# Altium footprint library THU VIEN PCB.PCBLib: 911 footprints (part 35 of 57)
Each footprint in its own frame and in the unit in brackets; x right, y up, seen from the top. Pads: shape width x height; smd on the part's side, far side on the other; paste and mask are expansions set on the pad; w line width, h text height; cw(c..) or ccw(c..) is an arc to the next point about the centre after c.
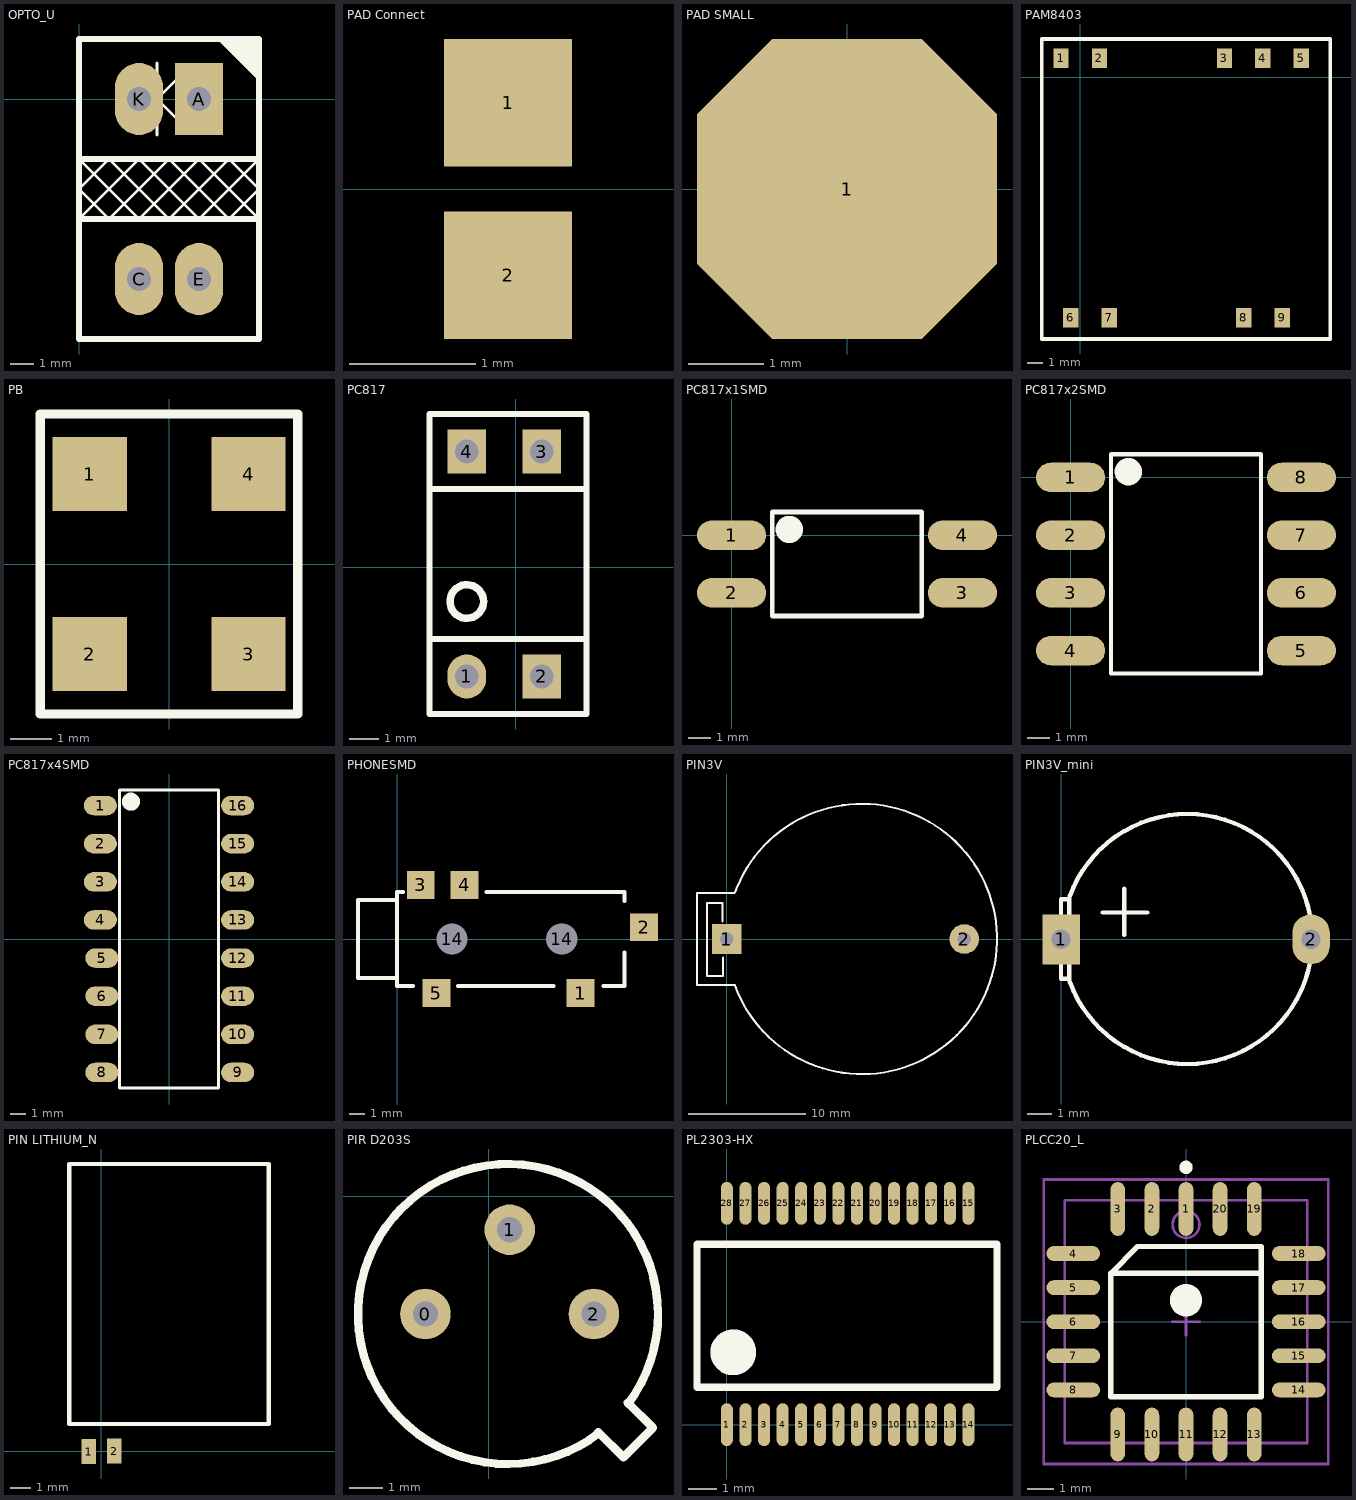
[diagram p34: the footprints below, top view; thin cyan lines are the x and y axes]

## OPTO_U [mil] "Opto hinh chu U"
height 104.33
pads (4):
  rect 80x120 hole 40: A(200,0)
  oval 80x120 hole 40: C(100,-300) E(200,-300) K(100,0)
Top Overlay:
  region: 297.5,97.5 232.5,97.5 297.5,32.5
  lines w5: 0,-200 50,-150 100,-100 200,-200 230,-170 300,-100 300,-200 200,-100 100,-200 90,-190 60,-160 0,-100 ; 130,-60 130,60 ; 180,-50 180,50 ; 180,-50 180,50 ; 180,-50 130,0 180,50 ; 0,-150 30,-180 50,-200 150,-100 250,-200 300,-150 250,-100 150,-200 50,-100 0,-150
  lines w10: 0,-200 300,-200 ; 0,-150 0,-110 ; 0,-100 300,-100 ; 300,-150 300,-140 ; 0,-400 300,-400 300,100 0,100 0,-400
3D body "SW3dPS-optek opb620.STEP": height 374.02, standoff -100, extent 43.46,-346.85 260,46.85

## PAD Connect [mil]
pads (2):
  rect 40x40 smd: 1(-66,27) 2(-66,-27)

## PAD SMALL [mm]
pads (1):
  oct 4x4 smd: 1(0,0)

## PAM8403 [mil]
pads (9):
  rect 40x50 smd: 1(-50,50) 2(50,50) 3(375,50) 4(475,50) 5(575,50) 6(-25,-625) 7(75,-625) 8(425,-625) 9(525,-625)
Top Overlay:
  lines w10: -100,-680 -100,100 650,100 650,-680 -75,-680 -100,-680

## PB [mil]
pads (4):
  rect 70x70 smd: 1(-75,85) 2(-75,-85) 3(75,-85) 4(75,85)
Top Overlay:
  lines w8.66: -121.75,-141.5 -121.75,141.75 121.5,141.75 121.5,-141.5 -121.75,-141.5

## PC817 [mm]
pads (4):
  oval 1.3x1.5 hole 0.8: 1(-1.651,-3.708)
  rect 1.3x1.5 hole 0.8: 2(0.889,-3.708) 3(0.889,3.912) 4(-1.651,3.912)
Top Overlay:
  circle w0.254: c-1.651,-1.168 r0.568
  lines w0.203: -2.921,-2.438 -2.921,-1.168 -2.921,1.372 -2.921,5.182 2.413,5.182 2.413,2.642 ; -2.921,-2.438 -2.921,-4.978 2.413,-4.978 2.413,-2.184 2.413,2.642 ; -2.921,-2.438 -2.921,2.642 ; -2.921,-2.438 2.413,-2.438 ; -2.921,-2.438 -2.921,2.642 ; -2.921,-2.438 2.413,-2.438 ; -2.921,2.642 2.413,2.642 ; -2.921,2.642 2.413,2.642 ; 2.413,-2.438 2.413,2.642
3D body "PC817.step": height 4.81, standoff -2.19, extent -2.6,-3.94 1.991,3.94

## PC817x1SMD [mil] "SMD"
height 196.85
pads (4):
  oval 120x51.18 smd: 1(0,0) 2(0,-100) 3(400,-100) 4(400,0)
Top Overlay:
  circle w39.37: c100,10 r3.94
  lines w7.87: 70.08,-140.16 329.92,-140.16 329.92,40.16 70.08,40.16 70.08,-140.16
3D body "PC817 SMD.STEP": height 152.24, standoff 0.6, extent 3.16,-140.16 396.86,40.16

## PC817x2SMD [mil]
pads (8):
  oval 120x51.18 smd: 1(0,0) 2(0,-100) 3(0,-200) 4(0,-300) 5(400,-300) 6(400,-200) 7(400,-100) 8(400,0)
Top Overlay:
  circle w39.37: c100,10 r3.94
  lines w7: 70,40 70,-340 330,-340 330,40
  lines w7.87: 70.08,40.16 329.92,40.16
3D body "PC817 SMD.STEP": height 152.24, standoff 0.6, extent 9,-340.16 402.7,-159.84
3D body "PC817 SMD.STEP": height 152.24, standoff 0.6, extent 6,-141.16 399.7,39.16

## PC817x4SMD [mm] "SMD"
height 5
pads (16):
  oval 2.2x1.3 smd: 1(-4.572,8.89) 2(-4.572,6.35) 3(-4.572,3.81) 4(-4.572,1.27) 5(-4.472,-1.27) 6(-4.472,-3.81) 7(-4.472,-6.35) 8(-4.472,-8.89) 9(4.572,-8.89) 10(4.572,-6.35) 11(4.572,-3.81) 12(4.572,-1.27) 13(4.572,1.27) 14(4.572,3.81) 15(4.572,6.35) 16(4.572,8.89)
Top Overlay:
  circle w1: c-2.54,9.144 r0.1
  lines w0.2: -3.3,-9.91 -3.3,9.91 3.3,9.91 3.3,-9.91 -3.3,-9.91
3D body "PC817 SMD.STEP": height 3.87, standoff 0.02, extent -4.928,5.305 5.072,9.885
3D body "PC817 SMD.STEP": height 3.87, standoff 0.02, extent -4.851,0.25 5.149,4.83
3D body "PC817 SMD.STEP": height 3.87, standoff 0.02, extent -4.928,-4.881 5.072,-0.301
3D body "PC817 SMD.STEP": height 3.87, standoff 0.02, extent -4.928,-9.91 5.072,-5.33

## PHONESMD [mil]
pads (7):
  rect 70x70 smd: 1(460.63,-135.83) 2(620.08,29.53) 3(59.05,135.83) 4(169.29,135.83) 5(98.43,-135.83)
  round 70 hole 78.74 unplated: 14(137.79,0) 14(413.39,0)
Top Overlay:
  lines w10: 0,-98.43 -98.43,-98.43 -98.43,98.43 0,98.43 ; 15,118.11 0,118.11 0,-118.11 40,-118.11 ; 153.11,-118.11 393.11,-118.11 ; 224.41,118.11 570.87,118.11 570.87,95.87 ; 518.11,-118.11 570.87,-118.11 570.87,-34.13

## PIN3V [mil] "Socket PIN 3V"
pads (2):
  rect 100x100 hole 45: 1(0,0)
  round 100 hole 45: 2(800,0)
Top Overlay:
  lines w7: -14,59 -14,121 -66,121 -66,-124 -13,-124 -13,-63 ; 26.33,155 -100,155 -100,-155 27.93,-155 ; 27.6,156.07 cw(c455,0) 27.93,-156.97
3D body "batter2.STEP": height 278.16, standoff -137.2, extent -128.09,-446.83 1001.83,448.83

## PIN3V_mini [mil] "Socket PIN 3V"
pads (2):
  rect 60x80 hole 31: 1(0,0)
  oval 60x80 hole 31: 2(400,0)
Top Overlay:
  lines w7: 11,64 0,64 0,-63 13,-63 ; 13,-64 13,65 ; 14,-67.81 ccw(c201.94,0.6) 14,69 ; 67,43 138,43 ; 101,7 101,81

## PIN LITHIUM_N [mil]
pads (2):
  rect 27.56x47.24 smd: 1(-24,-0.5) 2(24,0.5)
Top Overlay:
  lines w8: -61,51.5 317,51.5 317,544.5 -61,544.5 -61,51.5

## PIR D203S [mil]
pads (3):
  round 60 hole 30: 0(-75,-140) 1(25,-40) 2(125,-140)
Top Overlay:
  lines w10: 130,-280 160,-310 195,-275 165,-245 ; 131.09,-281.42 cw(c23,-140) 165.51,-246.64
3D body "PIR_S_Orginal.step": height 185.04, standoff -78.74, extent -154.13,-317.94 204.14,39.14

## PL2303-HX [mil]
pads (28):
  oval 16.53x59.03 smd mask+7.9: 1(0,0) 2(25.6,0) 3(51.18,0) 4(76.78,0) 5(102.37,0) 6(127.97,0) 7(153.57,0) 8(179.15,0) 9(204.75,0) 10(230.35,0) 11(255.93,0) 12(281.53,0) 13(307.12,0) 14(332.7,0) 15(332.7,305) 16(307.12,305) 17(281.53,305) 18(255.93,305) 19(230.35,305) 20(204.75,305) 21(179.15,305) 22(153.57,305) 23(127.97,305) 24(102.37,305) 25(76.78,305) 26(51.18,305) 27(25.6,305) 28(0,305)
Top Overlay:
  circle w39.37: c8.8,99.7 r11.88
  lines w10: -41.22,51.66 372.21,51.66 372.21,248.53 -41.22,248.53 -41.22,51.66
3D body "SOP65P770x200-28N.step": height 84.65, standoff 0, extent -37.01,0.01 369.69,305.35

## PLCC20_L [mm] "Leaded Chip Carrier, 20-Leads, Body 9x9mm, Pitch 1.27mm, IPC High Density"
height 4.57
pads (20):
  oval 0.55x2 smd: 1(0,4.2) 2(-1.27,4.2) 3(-2.54,4.2) 9(-2.54,-4.2) 10(-1.27,-4.2) 11(0,-4.2) 12(1.27,-4.2) 13(2.54,-4.2) 19(2.54,4.2) 20(1.27,4.2)
  oval 2x0.55 smd: 4(-4.2,2.54) 5(-4.2,1.27) 6(-4.2,0) 7(-4.2,-1.27) 8(-4.2,-2.54) 14(4.2,-2.54) 15(4.2,-1.27) 16(4.2,0) 17(4.2,1.27) 18(4.2,2.54)
Top Overlay:
  circle w0.6: c0,0.8 r0.3
  circle w0.25: c0,5.75 r0.125
  lines w0.2: 2.8,1.8 -2.8,1.8 ; -2.8,1.8 -2.8,-2.8 2.8,-2.8 2.8,2.8 -1.8,2.8 -2.8,1.8
Mechanical 13:
  circle w0.1: c0,3.62 r0.5
  lines w0.1: -4.52,-4.52 4.52,-4.52 4.52,4.52 -4.52,4.52 -4.52,-4.52
Mechanical 15:
  lines w0.1: -0.5,0 0.5,0 ; 0,-0.5 0,0.5 ; -5.3,-5.3 5.3,-5.3 5.3,5.3 -5.3,5.3 -5.3,-5.3
3D body: height 4.57, standoff 0, extent -4.52,-4.52 4.52,4.52